# Altium footprint library SMDLibrary.PcbLib: 309 footprints (part 15 of 20)
Each footprint in its own frame and in the unit in brackets; x right, y up, seen from the top. Pads: shape width x height; smd on the part's side, far side on the other; paste and mask are expansions set on the pad; w line width, h text height; cw(c..) or ccw(c..) is an arc to the next point about the centre after c.
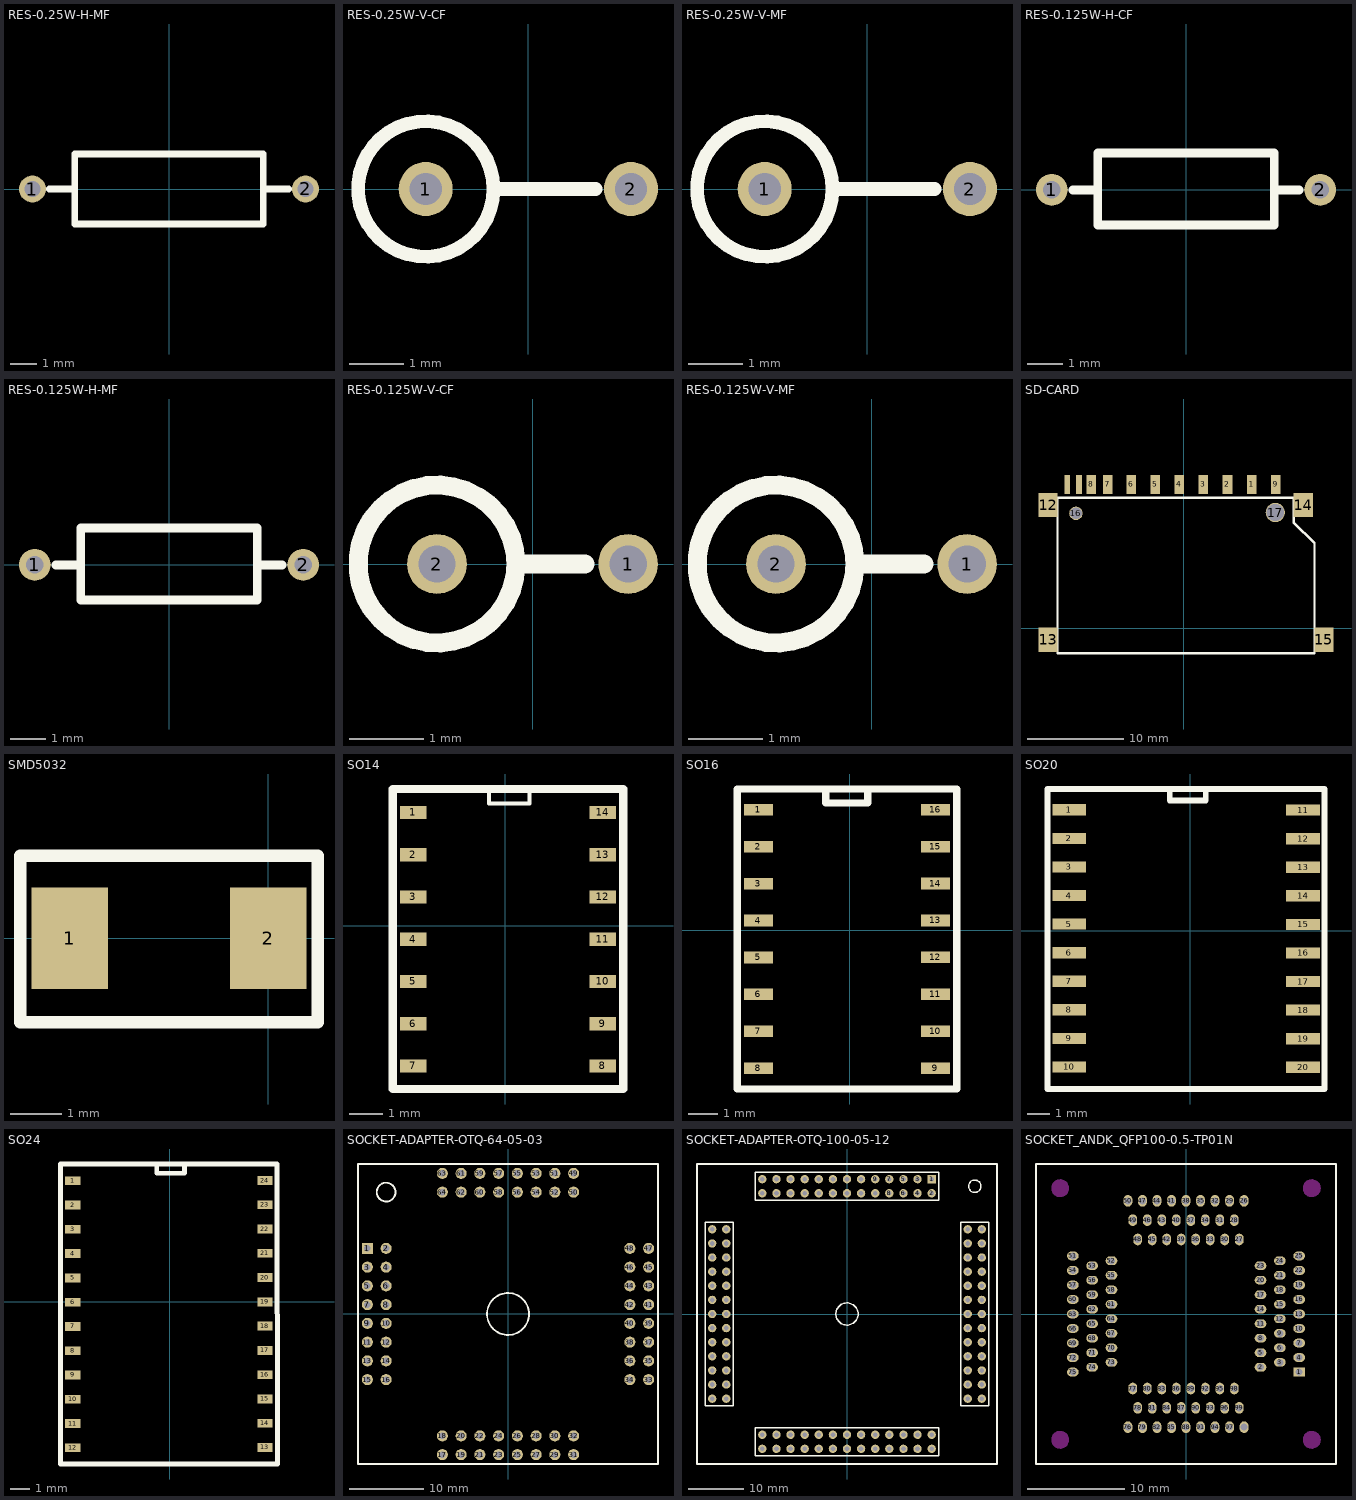
[diagram p14: the footprints below, top view; thin cyan lines are the x and y axes]

## RES-0.25W-H-MF [mm]
pads (2):
  round 1 hole 0.6: 1(-5.075,0) 2(5.075,0)
Top Overlay:
  lines w0.254: -4.45,0 -3.5,0 ; 3.5,0 4.45,0 ; -3.5,-1.3 3.5,-1.3 3.5,1.3 -3.5,1.3 -3.5,-1.3
3D body "RES-0.25W-H-MF.stp": height 2.69, standoff -2.5, extent -5.353,-1.297 5.355,1.298

## RES-0.25W-V-CF [mm]
pads (2):
  round 1 hole 0.6: 1(-1.9,0) 2(1.9,0)
Top Overlay:
  circle w0.254: c-1.9,0 r1.254
  lines w0.254: -0.646,0 1.25,0
3D body "RES-0.25W-V-CF.stp": height 9.5, standoff -2.5, extent -3.195,-1.297 2.178,1.298

## RES-0.25W-V-MF [mm]
pads (2):
  round 1 hole 0.6: 1(-1.9,0) 2(1.9,0)
Top Overlay:
  circle w0.254: c-1.9,0 r1.254
  lines w0.254: -0.646,0 1.25,0
3D body "RES-0.25W-V-MF.stp": height 9.5, standoff -2.5, extent -3.195,-1.297 2.178,1.298

## RES-0.125W-H-CF [mm]
pads (2):
  round 0.9 hole 0.5: 1(-3.8,0) 2(3.8,0)
Top Overlay:
  lines w0.254: -3.2,0 -2.5,0 ; 2.5,0 3.2,0 ; -2.5,-1 -2.5,1.05 2.5,1.05 2.5,-1 -2.5,-1
3D body "RES-0.125W-H-CF.stp": height 2.2, standoff -2.5, extent -4.033,-1.039 4.035,1.039

## RES-0.125W-H-MF [mm]
pads (2):
  round 0.9 hole 0.5: 1(-3.8,0) 2(3.8,0)
Top Overlay:
  lines w0.254: -3.2,0 -2.5,0 ; 2.5,0 3.2,0 ; -2.5,-1 -2.5,1.05 2.5,1.05 2.5,-1 -2.5,-1
3D body "RES-0.125W-H-MF.stp": height 2.2, standoff -2.5, extent -4.033,-1.039 4.035,1.04

## RES-0.125W-V-CF [mm]
pads (2):
  round 0.8 hole 0.5: 1(1.28,0) 2(-1.28,0)
Top Overlay:
  circle w0.254: c-1.28,0 r1.057
  lines w0.254: -0.2,0 0.7,0
3D body "RES-0.125W-V-CF.stp": height 5.73, standoff -2.5, extent -2.32,-1.039 1.493,1.039

## RES-0.125W-V-MF [mm]
pads (2):
  round 0.8 hole 0.5: 1(1.28,0) 2(-1.28,0)
Top Overlay:
  circle w0.254: c-1.28,0 r1.057
  lines w0.254: -0.2,0 0.7,0
3D body "RES-0.125W-V-MF.stp": height 5.73, standoff -2.5, extent -2.32,-1.039 1.493,1.04

## SD-CARD [mm]
pads (17):
  rect 1x2 smd: 1(7.057,14.947) 2(4.557,14.947) 3(2.057,14.947) 4(-0.443,14.947) 5(-2.943,14.947) 6(-5.443,14.947) 7(-7.868,14.947) 8(-9.568,14.947) 9(9.557,14.947)
  rect 0.6x2 smd: 10(-10.868,14.947) 11(-12.068,14.947)
  rect 2x2.5 smd: 12(-14.068,12.788) 13(-14.068,-1.182) 14(12.411,12.788) 15(14.57,-1.182)
  round 1.4 hole 1.2: 16(-11.168,11.947)
  round 2 hole 1.8: 17(9.522,12.026)
Top Overlay:
  lines w0.254: -13.084,-2.579 13.586,-2.579 13.586,8.851 11.427,11.01 11.427,13.55 -13.084,13.55 -13.084,-2.579
3D body "User Library-SD Kart.step": height 3, standoff -1, extent -14.151,-15.256 14.449,14.744

## SMD5032 [mm]
pads (2):
  rect 1.5x2 smd: 1(-3.9,0) 2(0,0)
Top Overlay:
  lines w0.254: -4.875,-1.65 -4.875,1.625 0.975,1.625 0.975,-1.65 -4.875,-1.65
3D body "User Library-5032_2.STEP": height 1.2, standoff -0.01, extent -4.453,-1.603 0.547,1.597

## SO14 [mm]
pads (14):
  rect 0.8x0.4 smd: 1(-2.76,3.41) 2(-2.76,2.14) 3(-2.76,0.87) 4(-2.76,-0.4) 5(-2.76,-1.67) 6(-2.76,-2.94) 7(-2.76,-4.21) 8(2.935,-4.21) 9(2.935,-2.94) 10(2.935,-1.67) 11(2.935,-0.4) 12(2.935,0.87) 13(2.935,2.14) 14(2.935,3.41)
Top Overlay:
  lines w0.12: -0.483,4.115 -0.483,3.683 0.737,3.683 0.737,4.115
  lines w0.254: -3.378,-4.902 3.556,-4.902 3.556,4.115 -3.378,4.115 -3.378,-4.902
3D body "SW3DPS-SO-14 (PIC16F684)-DEFAULT.STEP": height 1.6, standoff 0, extent -2.92,-4.745 3.07,3.945

## SO16 [mm]
pads (16):
  rect 1x0.4 smd: 1(-3.137,4.14) 2(-3.137,2.87) 3(-3.137,1.6) 4(-3.137,0.33) 5(-3.137,-0.94) 6(-3.137,-2.21) 7(-3.137,-3.48) 8(-3.137,-4.75) 9(2.948,-4.747) 10(2.948,-3.477) 11(2.948,-2.207) 12(2.948,-0.937) 13(2.948,0.333) 14(2.948,1.603) 15(2.948,2.873) 16(2.948,4.143)
Top Overlay:
  lines w0.254: -0.826,4.851 -0.826,4.369 0.622,4.369 0.622,4.686 ; -3.861,-5.461 3.683,-5.461 3.683,4.851 -3.861,4.851 -3.861,-5.461
3D body "User Library-so16-1.STEP": height 1.75, standoff -0.02, extent -3.17,-5.29 2.967,4.68

## SO20 [mm]
pads (20):
  rect 1.5x0.5 smd: 1(-5.383,5.374) 2(-5.383,4.104) 3(-5.383,2.834) 4(-5.383,1.564) 5(-5.383,0.294) 6(-5.383,-0.976) 7(-5.383,-2.246) 8(-5.383,-3.516) 9(-5.383,-4.786) 10(-5.383,-6.056) 11(5.01,5.362) 12(5.01,4.092) 13(5.01,2.822) 14(5.01,1.552) 15(5.01,0.282) 16(5.01,-0.988) 17(5.01,-2.258) 18(5.01,-3.528) 19(5.01,-4.798) 20(5.01,-6.068)
Top Overlay:
  lines w0.254: -0.914,6.248 -0.914,5.791 0.686,5.791 0.686,6.248 ; -6.35,-7.036 5.969,-7.036 5.969,6.299 -6.35,6.299 -6.35,-7.036
3D body "User Library-SOIC20_JEDEC_MS-013AC.STEP": height 2.66, standoff 0, extent -5.536,-6.851 5.094,6.149

## SO24 [mm]
pads (24):
  rect 0.8x0.46 smd: 1(-5.075,6.335) 2(-5.075,5.065) 3(-5.075,3.795) 4(-5.075,2.525) 5(-5.075,1.255) 6(-5.075,-0.015) 7(-5.075,-1.285) 8(-5.075,-2.555) 9(-5.075,-3.825) 10(-5.075,-5.095) 11(-5.075,-6.365) 12(-5.075,-7.635) 13(4.975,-7.62) 14(4.975,-6.35) 15(4.975,-5.08) 16(4.975,-3.81) 17(4.975,-2.54) 18(4.975,-1.27) 19(4.975,0) 20(4.975,1.27) 21(4.975,2.54) 22(4.975,3.81) 23(4.975,5.08) 24(4.975,6.35)
Top Overlay:
  lines w0.254: -0.686,7.188 -0.686,6.731 0.762,6.731 0.762,7.163 ; -5.715,-8.484 5.627,-8.484 5.601,7.214 -5.715,7.214 -5.715,-8.484
3D body "User Library-SO-24W.STEP": height 2.48, standoff 0, extent -5.205,-8.36 5.105,7.05

## SOCKET-ADAPTER-OTQ-64-05-03 [mm]
pads (64):
  rect 1.5x1.5 hole 0.85: 1(-19.05,8.89)
  round 1.5 hole 0.85: 2(-16.51,8.89) 3(-19.05,6.35) 4(-16.51,6.35) 5(-19.05,3.81) 6(-16.51,3.81) 7(-19.05,1.27) 8(-16.51,1.27) 9(-19.05,-1.27) 10(-16.51,-1.27) 11(-19.05,-3.81) 12(-16.51,-3.81) 13(-19.05,-6.35) 14(-16.51,-6.35) 15(-19.05,-8.89) 16(-16.51,-8.89) 17(-8.89,-19.05) 18(-8.89,-16.51) 19(-6.35,-19.05) 20(-6.35,-16.51) 21(-3.81,-19.05) 22(-3.81,-16.51) 23(-1.27,-19.05) 24(-1.27,-16.51) 25(1.27,-19.05) 26(1.27,-16.51) 27(3.81,-19.05) 28(3.81,-16.51) 29(6.35,-19.05) 30(6.35,-16.51) 31(8.89,-19.05) 32(8.89,-16.51) 33(19.05,-8.89) 34(16.51,-8.89) 35(19.05,-6.35) 36(16.51,-6.35) 37(19.05,-3.81) 38(16.51,-3.81) 39(19.05,-1.27) 40(16.51,-1.27) 41(19.05,1.27) 42(16.51,1.27) 43(19.05,3.81) 44(16.51,3.81) 45(19.05,6.35) 46(16.51,6.35) 47(19.05,8.89) 48(16.51,8.89) 49(8.89,19.05) 50(8.89,16.51) 51(6.35,19.05) 52(6.35,16.51) 53(3.81,19.05) 54(3.81,16.51) 55(1.27,19.05) 56(1.27,16.51) 57(-1.27,19.05) 58(-1.27,16.51) 59(-3.81,19.05) 60(-3.81,16.51) 61(-6.35,19.05) 62(-6.35,16.51) 63(-8.89,19.05) 64(-8.89,16.51)
Top Overlay:
  circle w0.254: c0,0 r2.84
  circle w0.254: c-16.51,16.51 r1.27
  lines w0.254: -20.32,-20.32 20.32,-20.32 20.32,20.32 -20.32,20.32 -20.32,-20.32
3D body "Pin Header 1x2 TH Pitch 2.54mm.stp": height 9.5, standoff -3.2, extent -2.54,15.24 0,20.32
3D body "Pin Header 1x2 TH Pitch 2.54mm.stp": height 9.5, standoff -3.2, extent 0,15.24 2.54,20.32
3D body "Pin Header 1x2 TH Pitch 2.54mm.stp": height 9.5, standoff -3.2, extent 7.62,15.24 10.16,20.32
3D body "Pin Header 1x2 TH Pitch 2.54mm.stp": height 9.5, standoff -3.2, extent 5.08,15.24 7.62,20.32
3D body "Pin Header 1x2 TH Pitch 2.54mm.stp": height 9.5, standoff -3.2, extent 2.54,15.24 5.08,20.32
3D body "Pin Header 1x2 TH Pitch 2.54mm.stp": height 9.5, standoff -3.2, extent -7.62,15.24 -5.08,20.32
3D body "Pin Header 1x2 TH Pitch 2.54mm.stp": height 9.5, standoff -3.2, extent -5.08,15.24 -2.54,20.32
3D body "Pin Header 1x2 TH Pitch 2.54mm.stp": height 9.5, standoff -3.2, extent -10.16,15.24 -7.62,20.32
3D body "Pin Header 1x2 TH Pitch 2.54mm.stp": height 9.5, standoff -3.2, extent 15.24,0 20.32,2.54
3D body "Pin Header 1x2 TH Pitch 2.54mm.stp": height 9.5, standoff -3.2, extent 15.24,-2.54 20.32,0
3D body "Pin Header 1x2 TH Pitch 2.54mm.stp": height 9.5, standoff -3.2, extent 15.24,-10.16 20.32,-7.62
3D body "Pin Header 1x2 TH Pitch 2.54mm.stp": height 9.5, standoff -3.2, extent 15.24,-7.62 20.32,-5.08
3D body "Pin Header 1x2 TH Pitch 2.54mm.stp": height 9.5, standoff -3.2, extent 15.24,-5.08 20.32,-2.54
3D body "Pin Header 1x2 TH Pitch 2.54mm.stp": height 9.5, standoff -3.2, extent 15.24,5.08 20.32,7.62
3D body "Pin Header 1x2 TH Pitch 2.54mm.stp": height 9.5, standoff -3.2, extent 15.24,2.54 20.32,5.08
3D body "Pin Header 1x2 TH Pitch 2.54mm.stp": height 9.5, standoff -3.2, extent 15.24,7.62 20.32,10.16
3D body "Pin Header 1x2 TH Pitch 2.54mm.stp": height 9.5, standoff -3.2, extent 0,-20.32 2.54,-15.24
3D body "Pin Header 1x2 TH Pitch 2.54mm.stp": height 9.5, standoff -3.2, extent -2.54,-20.32 0,-15.24
3D body "Pin Header 1x2 TH Pitch 2.54mm.stp": height 9.5, standoff -3.2, extent -10.16,-20.32 -7.62,-15.24
3D body "Pin Header 1x2 TH Pitch 2.54mm.stp": height 9.5, standoff -3.2, extent -7.62,-20.32 -5.08,-15.24
3D body "Pin Header 1x2 TH Pitch 2.54mm.stp": height 9.5, standoff -3.2, extent -5.08,-20.32 -2.54,-15.24
3D body "Pin Header 1x2 TH Pitch 2.54mm.stp": height 9.5, standoff -3.2, extent 5.08,-20.32 7.62,-15.24
3D body "Pin Header 1x2 TH Pitch 2.54mm.stp": height 9.5, standoff -3.2, extent 2.54,-20.32 5.08,-15.24
3D body "Pin Header 1x2 TH Pitch 2.54mm.stp": height 9.5, standoff -3.2, extent 7.62,-20.32 10.16,-15.24
3D body "Pin Header 1x2 TH Pitch 2.54mm.stp": height 9.5, standoff -3.2, extent -20.32,-2.54 -15.24,0
3D body "Pin Header 1x2 TH Pitch 2.54mm.stp": height 9.5, standoff -3.2, extent -20.32,0 -15.24,2.54
3D body "Pin Header 1x2 TH Pitch 2.54mm.stp": height 9.5, standoff -3.2, extent -20.32,7.62 -15.24,10.16
3D body "Pin Header 1x2 TH Pitch 2.54mm.stp": height 9.5, standoff -3.2, extent -20.32,5.08 -15.24,7.62
3D body "Pin Header 1x2 TH Pitch 2.54mm.stp": height 9.5, standoff -3.2, extent -20.32,2.54 -15.24,5.08
3D body "Pin Header 1x2 TH Pitch 2.54mm.stp": height 9.5, standoff -3.2, extent -20.32,-7.62 -15.24,-5.08
3D body "Pin Header 1x2 TH Pitch 2.54mm.stp": height 9.5, standoff -3.2, extent -20.32,-5.08 -15.24,-2.54
3D body "Pin Header 1x2 TH Pitch 2.54mm.stp": height 9.5, standoff -3.2, extent -20.32,-10.16 -15.24,-7.62

## SOCKET-ADAPTER-OTQ-100-05-12 [mm]
pads (104):
  rect 1.5x1.5 hole 0.85: 1(15.24,24.27)
  round 1.5 hole 0.85: 2(15.24,21.73) 3(12.7,24.27) 4(12.7,21.73) 5(10.16,24.27) 6(10.16,21.73) 7(7.62,24.27) 8(7.62,21.73) 9(5.08,24.27) 10(5.08,21.73) 11(2.54,24.27) 12(2.54,21.73) 13(0,24.27) 14(0,21.73) 15(-2.54,24.27) 16(-2.54,21.73) 17(-5.08,24.27) 18(-5.08,21.73) 19(-7.62,24.27) 20(-7.62,21.73) 21(-10.16,24.27) 22(-10.16,21.73) 23(-12.7,24.27) 24(-12.7,21.73) 25(-15.24,24.27) 26(-21.73,15.24) 27(-24.27,12.7) 28(-21.73,12.7) 29(-24.27,10.16) 30(-21.73,10.16) 31(-24.27,7.62) 32(-21.73,7.62) 33(-24.27,5.08) 34(-21.73,5.08) 35(-24.27,2.54) 36(-21.73,2.54) 37(-24.27,0) 38(-21.73,0) 39(-24.27,-2.54) 40(-21.73,-2.54) 41(-24.27,-5.08) 42(-21.73,-5.08) 43(-24.27,-7.62) 44(-21.73,-7.62) 45(-24.27,-10.16) 46(-21.73,-10.16) 47(-24.27,-12.7) 48(-21.73,-12.7) 49(-24.27,-15.24) 50(-21.73,-15.24) 51(-15.24,-24.27) 52(-15.24,-21.73) 53(-12.7,-24.27) 54(-12.7,-21.73) 55(-10.16,-24.27) 56(-10.16,-21.73) 57(-7.62,-24.27) 58(-7.62,-21.73) 59(-5.08,-24.27) 60(-5.08,-21.73) 61(-2.54,-24.27) 62(-2.54,-21.73) 63(0,-24.27) 64(0,-21.73) 65(2.54,-24.27) 66(2.54,-21.73) 67(5.08,-24.27) 68(5.08,-21.73) 69(7.62,-24.27) 70(7.62,-21.73) 71(10.16,-24.27) 72(10.16,-21.73) 73(12.7,-24.27) 74(12.7,-21.73) 75(15.24,-24.27) 76(21.73,-15.24) 77(24.27,-12.7) 78(21.73,-12.7) 79(24.27,-10.16) 80(21.73,-10.16) 81(24.27,-7.62) 82(21.73,-7.62) 83(24.27,-5.08) 84(21.73,-5.08) 85(24.27,-2.54) 86(21.73,-2.54) 87(24.27,0) 88(21.73,0) 89(24.27,2.54) 90(21.73,2.54) 91(24.27,5.08) 92(21.73,5.08) 93(24.27,7.62) 94(21.73,7.62) 95(24.27,10.16) 96(21.73,10.16) 97(24.27,12.7) 98(21.73,12.7) 99(24.27,15.24) 100(21.73,15.24) 101(-15.24,21.73) 102(-24.27,15.24) 103(15.24,-21.73) 104(24.27,-15.24)
Top Overlay:
  circle w0.254: c23,23 r1.118
  circle w0.254: c0,0 r2
  lines w0.254: -20.46,16.51 -20.46,-16.509 -25.54,-16.509 -25.54,16.51 -20.46,16.51 ; -20.46,16.51 -20.46,16.51 ; -16.51,-20.46 -16.51,-25.54 16.509,-25.54 16.509,-20.46 -16.51,-20.46 ; -16.51,-20.46 -16.51,-20.46 ; 16.51,20.46 16.51,20.46 ; 16.51,20.46 -16.509,20.46 -16.509,25.54 16.51,25.54 16.51,20.46 ; 20.46,-16.51 25.54,-16.51 25.54,16.509 20.46,16.509 20.46,-16.51 ; 20.46,-16.51 20.46,-16.51
  lines w0.3: -27,-27 -27,27 27,27 27,-27 -27,-27
3D body "zl201-1_p2-54_l2-54_w2-54_h8-89.stp": height 8.89, standoff -3.05, extent 20.46,-1.27 23,1.27
3D body "zl201-1_p2-54_l2-54_w2-54_h8-89.stp": height 8.89, standoff -3.05, extent 20.46,1.27 23,3.81
3D body "zl201-1_p2-54_l2-54_w2-54_h8-89.stp": height 8.89, standoff -3.05, extent 20.46,-3.81 23,-1.27
3D body "zl201-1_p2-54_l2-54_w2-54_h8-89.stp": height 8.89, standoff -3.05, extent 20.46,-6.35 23,-3.81
3D body "zl201-1_p2-54_l2-54_w2-54_h8-89.stp": height 8.89, standoff -3.05, extent 20.46,-8.89 23,-6.35
3D body "zl201-1_p2-54_l2-54_w2-54_h8-89.stp": height 8.89, standoff -3.05, extent 20.46,-11.43 23,-8.89
3D body "zl201-1_p2-54_l2-54_w2-54_h8-89.stp": height 8.89, standoff -3.05, extent 23,1.27 25.54,3.81
3D body "zl201-1_p2-54_l2-54_w2-54_h8-89.stp": height 8.89, standoff -3.05, extent 23,-1.27 25.54,1.27
3D body "zl201-1_p2-54_l2-54_w2-54_h8-89.stp": height 8.89, standoff -3.05, extent 23,-3.81 25.54,-1.27
3D body "zl201-1_p2-54_l2-54_w2-54_h8-89.stp": height 8.89, standoff -3.05, extent 23,-6.35 25.54,-3.81
3D body "zl201-1_p2-54_l2-54_w2-54_h8-89.stp": height 8.89, standoff -3.05, extent 23,-8.89 25.54,-6.35
3D body "zl201-1_p2-54_l2-54_w2-54_h8-89.stp": height 8.89, standoff -3.05, extent 23,-11.43 25.54,-8.89
3D body "zl201-1_p2-54_l2-54_w2-54_h8-89.stp": height 8.89, standoff -3.05, extent 20.46,-13.97 23,-11.43
3D body "zl201-1_p2-54_l2-54_w2-54_h8-89.stp": height 8.89, standoff -3.05, extent 23,-13.97 25.54,-11.43
3D body "zl201-1_p2-54_l2-54_w2-54_h8-89.stp": height 8.89, standoff -3.05, extent 20.46,-16.51 23,-13.97
3D body "zl201-1_p2-54_l2-54_w2-54_h8-89.stp": height 8.89, standoff -3.05, extent 23,-16.51 25.54,-13.97
3D body "zl201-1_p2-54_l2-54_w2-54_h8-89.stp": height 8.89, standoff -3.05, extent 23,3.81 25.54,6.35
3D body "zl201-1_p2-54_l2-54_w2-54_h8-89.stp": height 8.89, standoff -3.05, extent 20.46,3.81 23,6.35
3D body "zl201-1_p2-54_l2-54_w2-54_h8-89.stp": height 8.89, standoff -3.05, extent 23,6.35 25.54,8.89
3D body "zl201-1_p2-54_l2-54_w2-54_h8-89.stp": height 8.89, standoff -3.05, extent 20.46,6.35 23,8.89
3D body "zl201-1_p2-54_l2-54_w2-54_h8-89.stp": height 8.89, standoff -3.05, extent 23,8.89 25.54,11.43
3D body "zl201-1_p2-54_l2-54_w2-54_h8-89.stp": height 8.89, standoff -3.05, extent 20.46,8.89 23,11.43
3D body "zl201-1_p2-54_l2-54_w2-54_h8-89.stp": height 8.89, standoff -3.05, extent 20.46,11.429 23,13.969
3D body "zl201-1_p2-54_l2-54_w2-54_h8-89.stp": height 8.89, standoff -3.05, extent 23,11.429 25.54,13.969
3D body "zl201-1_p2-54_l2-54_w2-54_h8-89.stp": height 8.89, standoff -3.05, extent 20.46,13.969 23,16.509
3D body "zl201-1_p2-54_l2-54_w2-54_h8-89.stp": height 8.89, standoff -3.05, extent 23,13.969 25.54,16.509
3D body "zl201-1_p2-54_l2-54_w2-54_h8-89.stp": height 8.89, standoff -3.05, extent -1.27,-23 1.27,-20.46
3D body "zl201-1_p2-54_l2-54_w2-54_h8-89.stp": height 8.89, standoff -3.05, extent 1.27,-23 3.81,-20.46
3D body "zl201-1_p2-54_l2-54_w2-54_h8-89.stp": height 8.89, standoff -3.05, extent -3.81,-23 -1.27,-20.46
3D body "zl201-1_p2-54_l2-54_w2-54_h8-89.stp": height 8.89, standoff -3.05, extent -6.35,-23 -3.81,-20.46
3D body "zl201-1_p2-54_l2-54_w2-54_h8-89.stp": height 8.89, standoff -3.05, extent -8.89,-23 -6.35,-20.46
3D body "zl201-1_p2-54_l2-54_w2-54_h8-89.stp": height 8.89, standoff -3.05, extent -11.43,-23 -8.89,-20.46
3D body "zl201-1_p2-54_l2-54_w2-54_h8-89.stp": height 8.89, standoff -3.05, extent 1.27,-25.54 3.81,-23
3D body "zl201-1_p2-54_l2-54_w2-54_h8-89.stp": height 8.89, standoff -3.05, extent -1.27,-25.54 1.27,-23
3D body "zl201-1_p2-54_l2-54_w2-54_h8-89.stp": height 8.89, standoff -3.05, extent -3.81,-25.54 -1.27,-23
3D body "zl201-1_p2-54_l2-54_w2-54_h8-89.stp": height 8.89, standoff -3.05, extent -6.35,-25.54 -3.81,-23
3D body "zl201-1_p2-54_l2-54_w2-54_h8-89.stp": height 8.89, standoff -3.05, extent -8.89,-25.54 -6.35,-23
3D body "zl201-1_p2-54_l2-54_w2-54_h8-89.stp": height 8.89, standoff -3.05, extent -11.43,-25.54 -8.89,-23
3D body "zl201-1_p2-54_l2-54_w2-54_h8-89.stp": height 8.89, standoff -3.05, extent -13.97,-23 -11.43,-20.46
3D body "zl201-1_p2-54_l2-54_w2-54_h8-89.stp": height 8.89, standoff -3.05, extent -13.97,-25.54 -11.43,-23
3D body "zl201-1_p2-54_l2-54_w2-54_h8-89.stp": height 8.89, standoff -3.05, extent -16.51,-23 -13.97,-20.46
3D body "zl201-1_p2-54_l2-54_w2-54_h8-89.stp": height 8.89, standoff -3.05, extent -16.51,-25.54 -13.97,-23
3D body "zl201-1_p2-54_l2-54_w2-54_h8-89.stp": height 8.89, standoff -3.05, extent 3.81,-25.54 6.35,-23
3D body "zl201-1_p2-54_l2-54_w2-54_h8-89.stp": height 8.89, standoff -3.05, extent 3.81,-23 6.35,-20.46
3D body "zl201-1_p2-54_l2-54_w2-54_h8-89.stp": height 8.89, standoff -3.05, extent 6.35,-25.54 8.89,-23
3D body "zl201-1_p2-54_l2-54_w2-54_h8-89.stp": height 8.89, standoff -3.05, extent 6.35,-23 8.89,-20.46
3D body "zl201-1_p2-54_l2-54_w2-54_h8-89.stp": height 8.89, standoff -3.05, extent 8.89,-25.54 11.43,-23
3D body "zl201-1_p2-54_l2-54_w2-54_h8-89.stp": height 8.89, standoff -3.05, extent 8.89,-23 11.43,-20.46
3D body "zl201-1_p2-54_l2-54_w2-54_h8-89.stp": height 8.89, standoff -3.05, extent 11.429,-23 13.969,-20.46
3D body "zl201-1_p2-54_l2-54_w2-54_h8-89.stp": height 8.89, standoff -3.05, extent 11.429,-25.54 13.969,-23
3D body "zl201-1_p2-54_l2-54_w2-54_h8-89.stp": height 8.89, standoff -3.05, extent 13.969,-23 16.509,-20.46
3D body "zl201-1_p2-54_l2-54_w2-54_h8-89.stp": height 8.89, standoff -3.05, extent 13.969,-25.54 16.509,-23
3D body "zl201-1_p2-54_l2-54_w2-54_h8-89.stp": height 8.89, standoff -3.05, extent -25.54,-16.509 -23,-13.969
3D body "zl201-1_p2-54_l2-54_w2-54_h8-89.stp": height 8.89, standoff -3.05, extent -23,-16.509 -20.46,-13.969
3D body "zl201-1_p2-54_l2-54_w2-54_h8-89.stp": height 8.89, standoff -3.05, extent -25.54,-13.969 -23,-11.429
3D body "zl201-1_p2-54_l2-54_w2-54_h8-89.stp": height 8.89, standoff -3.05, extent -23,-13.969 -20.46,-11.429
3D body "zl201-1_p2-54_l2-54_w2-54_h8-89.stp": height 8.89, standoff -3.05, extent -23,-11.43 -20.46,-8.89
3D body "zl201-1_p2-54_l2-54_w2-54_h8-89.stp": height 8.89, standoff -3.05, extent -25.54,-11.43 -23,-8.89
3D body "zl201-1_p2-54_l2-54_w2-54_h8-89.stp": height 8.89, standoff -3.05, extent -23,-8.89 -20.46,-6.35
3D body "zl201-1_p2-54_l2-54_w2-54_h8-89.stp": height 8.89, standoff -3.05, extent -25.54,-8.89 -23,-6.35
3D body "zl201-1_p2-54_l2-54_w2-54_h8-89.stp": height 8.89, standoff -3.05, extent -23,-6.35 -20.46,-3.81
3D body "zl201-1_p2-54_l2-54_w2-54_h8-89.stp": height 8.89, standoff -3.05, extent -25.54,-6.35 -23,-3.81
3D body "zl201-1_p2-54_l2-54_w2-54_h8-89.stp": height 8.89, standoff -3.05, extent -25.54,13.97 -23,16.51
3D body "zl201-1_p2-54_l2-54_w2-54_h8-89.stp": height 8.89, standoff -3.05, extent -23,13.97 -20.46,16.51
3D body "zl201-1_p2-54_l2-54_w2-54_h8-89.stp": height 8.89, standoff -3.05, extent -25.54,11.43 -23,13.97
3D body "zl201-1_p2-54_l2-54_w2-54_h8-89.stp": height 8.89, standoff -3.05, extent -23,11.43 -20.46,13.97
3D body "zl201-1_p2-54_l2-54_w2-54_h8-89.stp": height 8.89, standoff -3.05, extent -25.54,8.89 -23,11.43
3D body "zl201-1_p2-54_l2-54_w2-54_h8-89.stp": height 8.89, standoff -3.05, extent -25.54,6.35 -23,8.89
3D body "zl201-1_p2-54_l2-54_w2-54_h8-89.stp": height 8.89, standoff -3.05, extent -25.54,3.81 -23,6.35
3D body "zl201-1_p2-54_l2-54_w2-54_h8-89.stp": height 8.89, standoff -3.05, extent -25.54,1.27 -23,3.81
3D body "zl201-1_p2-54_l2-54_w2-54_h8-89.stp": height 8.89, standoff -3.05, extent -25.54,-1.27 -23,1.27
3D body "zl201-1_p2-54_l2-54_w2-54_h8-89.stp": height 8.89, standoff -3.05, extent -25.54,-3.81 -23,-1.27
3D body "zl201-1_p2-54_l2-54_w2-54_h8-89.stp": height 8.89, standoff -3.05, extent -23,8.89 -20.46,11.43
3D body "zl201-1_p2-54_l2-54_w2-54_h8-89.stp": height 8.89, standoff -3.05, extent -23,6.35 -20.46,8.89
3D body "zl201-1_p2-54_l2-54_w2-54_h8-89.stp": height 8.89, standoff -3.05, extent -23,3.81 -20.46,6.35
3D body "zl201-1_p2-54_l2-54_w2-54_h8-89.stp": height 8.89, standoff -3.05, extent -23,1.27 -20.46,3.81
3D body "zl201-1_p2-54_l2-54_w2-54_h8-89.stp": height 8.89, standoff -3.05, extent -23,-3.81 -20.46,-1.27
3D body "zl201-1_p2-54_l2-54_w2-54_h8-89.stp": height 8.89, standoff -3.05, extent -23,-1.27 -20.46,1.27
3D body "zl201-1_p2-54_l2-54_w2-54_h8-89.stp": height 8.89, standoff -3.05, extent -16.509,23 -13.969,25.54
3D body "zl201-1_p2-54_l2-54_w2-54_h8-89.stp": height 8.89, standoff -3.05, extent -16.509,20.46 -13.969,23
3D body "zl201-1_p2-54_l2-54_w2-54_h8-89.stp": height 8.89, standoff -3.05, extent -13.969,23 -11.429,25.54
3D body "zl201-1_p2-54_l2-54_w2-54_h8-89.stp": height 8.89, standoff -3.05, extent -13.969,20.46 -11.429,23
3D body "zl201-1_p2-54_l2-54_w2-54_h8-89.stp": height 8.89, standoff -3.05, extent -11.43,20.46 -8.89,23
3D body "zl201-1_p2-54_l2-54_w2-54_h8-89.stp": height 8.89, standoff -3.05, extent -11.43,23 -8.89,25.54
3D body "zl201-1_p2-54_l2-54_w2-54_h8-89.stp": height 8.89, standoff -3.05, extent -8.89,20.46 -6.35,23
3D body "zl201-1_p2-54_l2-54_w2-54_h8-89.stp": height 8.89, standoff -3.05, extent -8.89,23 -6.35,25.54
3D body "zl201-1_p2-54_l2-54_w2-54_h8-89.stp": height 8.89, standoff -3.05, extent -6.35,20.46 -3.81,23
3D body "zl201-1_p2-54_l2-54_w2-54_h8-89.stp": height 8.89, standoff -3.05, extent -6.35,23 -3.81,25.54
3D body "zl201-1_p2-54_l2-54_w2-54_h8-89.stp": height 8.89, standoff -3.05, extent 13.97,23 16.51,25.54
3D body "zl201-1_p2-54_l2-54_w2-54_h8-89.stp": height 8.89, standoff -3.05, extent 13.97,20.46 16.51,23
3D body "zl201-1_p2-54_l2-54_w2-54_h8-89.stp": height 8.89, standoff -3.05, extent 11.43,23 13.97,25.54
3D body "zl201-1_p2-54_l2-54_w2-54_h8-89.stp": height 8.89, standoff -3.05, extent 11.43,20.46 13.97,23
3D body "zl201-1_p2-54_l2-54_w2-54_h8-89.stp": height 8.89, standoff -3.05, extent 8.89,23 11.43,25.54
3D body "zl201-1_p2-54_l2-54_w2-54_h8-89.stp": height 8.89, standoff -3.05, extent 6.35,23 8.89,25.54
3D body "zl201-1_p2-54_l2-54_w2-54_h8-89.stp": height 8.89, standoff -3.05, extent 3.81,23 6.35,25.54
3D body "zl201-1_p2-54_l2-54_w2-54_h8-89.stp": height 8.89, standoff -3.05, extent 1.27,23 3.81,25.54
3D body "zl201-1_p2-54_l2-54_w2-54_h8-89.stp": height 8.89, standoff -3.05, extent -1.27,23 1.27,25.54
3D body "zl201-1_p2-54_l2-54_w2-54_h8-89.stp": height 8.89, standoff -3.05, extent -3.81,23 -1.27,25.54
3D body "zl201-1_p2-54_l2-54_w2-54_h8-89.stp": height 8.89, standoff -3.05, extent 8.89,20.46 11.43,23
3D body "zl201-1_p2-54_l2-54_w2-54_h8-89.stp": height 8.89, standoff -3.05, extent 6.35,20.46 8.89,23
3D body "zl201-1_p2-54_l2-54_w2-54_h8-89.stp": height 8.89, standoff -3.05, extent 3.81,20.46 6.35,23
3D body "zl201-1_p2-54_l2-54_w2-54_h8-89.stp": height 8.89, standoff -3.05, extent 1.27,20.46 3.81,23
3D body "zl201-1_p2-54_l2-54_w2-54_h8-89.stp": height 8.89, standoff -3.05, extent -3.81,20.46 -1.27,23
3D body "zl201-1_p2-54_l2-54_w2-54_h8-89.stp": height 8.89, standoff -3.05, extent -1.27,20.46 1.27,23

## SOCKET_ANDK_QFP100-0.5-TP01N [mm]
pads (100):
  rect 1.2x0.9 hole 0.72: 1(11.7,-6)
  oval 1.2x0.9 hole 0.72: 2(7.7,-5.5) 3(9.7,-5) 4(11.7,-4.5) 5(7.7,-4) 6(9.7,-3.5) 7(11.7,-3) 8(7.7,-2.5) 9(9.7,-2) 10(11.7,-1.5) 11(7.7,-1) 12(9.7,-0.5) 13(11.7,0) 14(7.7,0.5) 15(9.7,1) 16(11.7,1.5) 17(7.7,2) 18(9.7,2.5) 19(11.7,3) 20(7.7,3.5) 21(9.7,4) 22(11.7,4.5) 23(7.7,5) 24(9.7,5.5) 25(11.7,6) 51(-11.7,6) 52(-7.7,5.5) 53(-9.7,5) 54(-11.7,4.5) 55(-7.7,4) 56(-9.7,3.5) 57(-11.7,3) 58(-7.7,2.5) 59(-9.7,2) 60(-11.7,1.5) 61(-7.7,1) 62(-9.7,0.5) 63(-11.7,0) 64(-7.7,-0.5) 65(-9.7,-1) 66(-11.7,-1.5) 67(-7.7,-2) 68(-9.7,-2.5) 69(-11.7,-3) 70(-7.7,-3.5) 71(-9.7,-4) 72(-11.7,-4.5) 73(-7.7,-5) 74(-9.7,-5.5) 75(-11.7,-6)
  oval 0.9x1.2 hole 0.72: 26(6,11.7) 27(5.5,7.7) 28(5,9.7) 29(4.5,11.7) 30(4,7.7) 31(3.5,9.7) 32(3,11.7) 33(2.5,7.7) 34(2,9.7) 35(1.5,11.7) 36(1,7.7) 37(0.5,9.7) 38(0,11.7) 39(-0.5,7.7) 40(-1,9.7) 41(-1.5,11.7) 42(-2,7.7) 43(-2.5,9.7) 44(-3,11.7) 45(-3.5,7.7) 46(-4,9.7) 47(-4.5,11.7) 48(-5,7.7) 49(-5.5,9.7) 50(-6,11.7) 76(-6,-11.7) 77(-5.5,-7.7) 78(-5,-9.7) 79(-4.5,-11.7) 80(-4,-7.7) 81(-3.5,-9.7) 82(-3,-11.7) 83(-2.5,-7.7) 84(-2,-9.7) 85(-1.5,-11.7) 86(-1,-7.7) 87(-0.5,-9.7) 88(0,-11.7) 89(0.5,-7.7) 90(1,-9.7) 91(1.5,-11.7) 92(2,-7.7) 93(2.5,-9.7) 94(3,-11.7) 95(3.5,-7.7) 96(4,-9.7) 97(4.5,-11.7) 98(5,-7.7) 99(5.5,-9.7) 100(6,-11.7)
Top Overlay:
  lines w0.254: -15.5,-15.5 -15.5,15.5 15.5,15.5 15.5,-15.5 -15.5,-15.5
Keep-Out Layer:
  board cut-out: -13,-13.8 -13.079,-13.8 -13.233,-13.769 -13.379,-13.709 -13.51,-13.621 -13.621,-13.51 -13.709,-13.379 -13.769,-13.233 -13.8,-13.079 -13.8,-13 -13.8,-12.921 -13.769,-12.767 -13.709,-12.621 -13.621,-12.49 -13.51,-12.379 -13.379,-12.291 -13.233,-12.231 -13.079,-12.2 -13,-12.2 -12.921,-12.2 -12.767,-12.231 -12.621,-12.291 -12.49,-12.379 -12.379,-12.49 -12.291,-12.621 -12.231,-12.767 -12.2,-12.921 -12.2,-13 -12.2,-13.079 -12.231,-13.233 -12.291,-13.379 -12.379,-13.51 -12.49,-13.621 -12.621,-13.709 -12.767,-13.769 -12.921,-13.8
  board cut-out: 12.2,-13 12.2,-13.079 12.231,-13.233 12.291,-13.379 12.379,-13.51 12.49,-13.621 12.621,-13.709 12.767,-13.769 12.921,-13.8 13,-13.8 13.079,-13.8 13.233,-13.769 13.379,-13.709 13.51,-13.621 13.621,-13.51 13.709,-13.379 13.769,-13.233 13.8,-13.079 13.8,-13 13.8,-12.921 13.769,-12.767 13.709,-12.621 13.621,-12.49 13.51,-12.379 13.379,-12.291 13.233,-12.231 13.079,-12.2 13,-12.2 12.921,-12.2 12.767,-12.231 12.621,-12.291 12.49,-12.379 12.379,-12.49 12.291,-12.621 12.231,-12.767 12.2,-12.921
  board cut-out: 13,12.2 12.921,12.2 12.767,12.231 12.621,12.291 12.49,12.379 12.379,12.49 12.291,12.621 12.231,12.767 12.2,12.921 12.2,13 12.2,13.079 12.231,13.233 12.291,13.379 12.379,13.51 12.49,13.621 12.621,13.709 12.767,13.769 12.921,13.8 13,13.8 13.079,13.8 13.233,13.769 13.379,13.709 13.51,13.621 13.621,13.51 13.709,13.379 13.769,13.233 13.8,13.079 13.8,13 13.8,12.921 13.769,12.767 13.709,12.621 13.621,12.49 13.51,12.379 13.379,12.291 13.233,12.231 13.079,12.2
  board cut-out: -13,12.2 -13.079,12.2 -13.233,12.231 -13.379,12.291 -13.51,12.379 -13.621,12.49 -13.709,12.621 -13.769,12.767 -13.8,12.921 -13.8,13 -13.8,13.079 -13.769,13.233 -13.709,13.379 -13.621,13.51 -13.51,13.621 -13.379,13.709 -13.233,13.769 -13.079,13.8 -13,13.8 -12.921,13.8 -12.767,13.769 -12.621,13.709 -12.49,13.621 -12.379,13.51 -12.291,13.379 -12.231,13.233 -12.2,13.079 -12.2,13 -12.2,12.921 -12.231,12.767 -12.291,12.621 -12.379,12.49 -12.49,12.379 -12.621,12.291 -12.767,12.231 -12.921,12.2
Keep-Out Layer:
  circle w0.254: c-13,-13 r0.8
  circle w0.254: c13,-13 r0.8
  circle w0.254: c13,13 r0.8
  circle w0.254: c-13,13 r0.8